# Altium footprint library 电阻封装库.PcbLib: 218 footprints (part 6 of 14)
Each footprint in its own frame and in the unit in brackets; x right, y up, seen from the top. Pads: shape width x height; smd on the part's side, far side on the other; paste and mask are expansions set on the pad; w line width, h text height; cw(c..) or ccw(c..) is an arc to the next point about the centre after c.
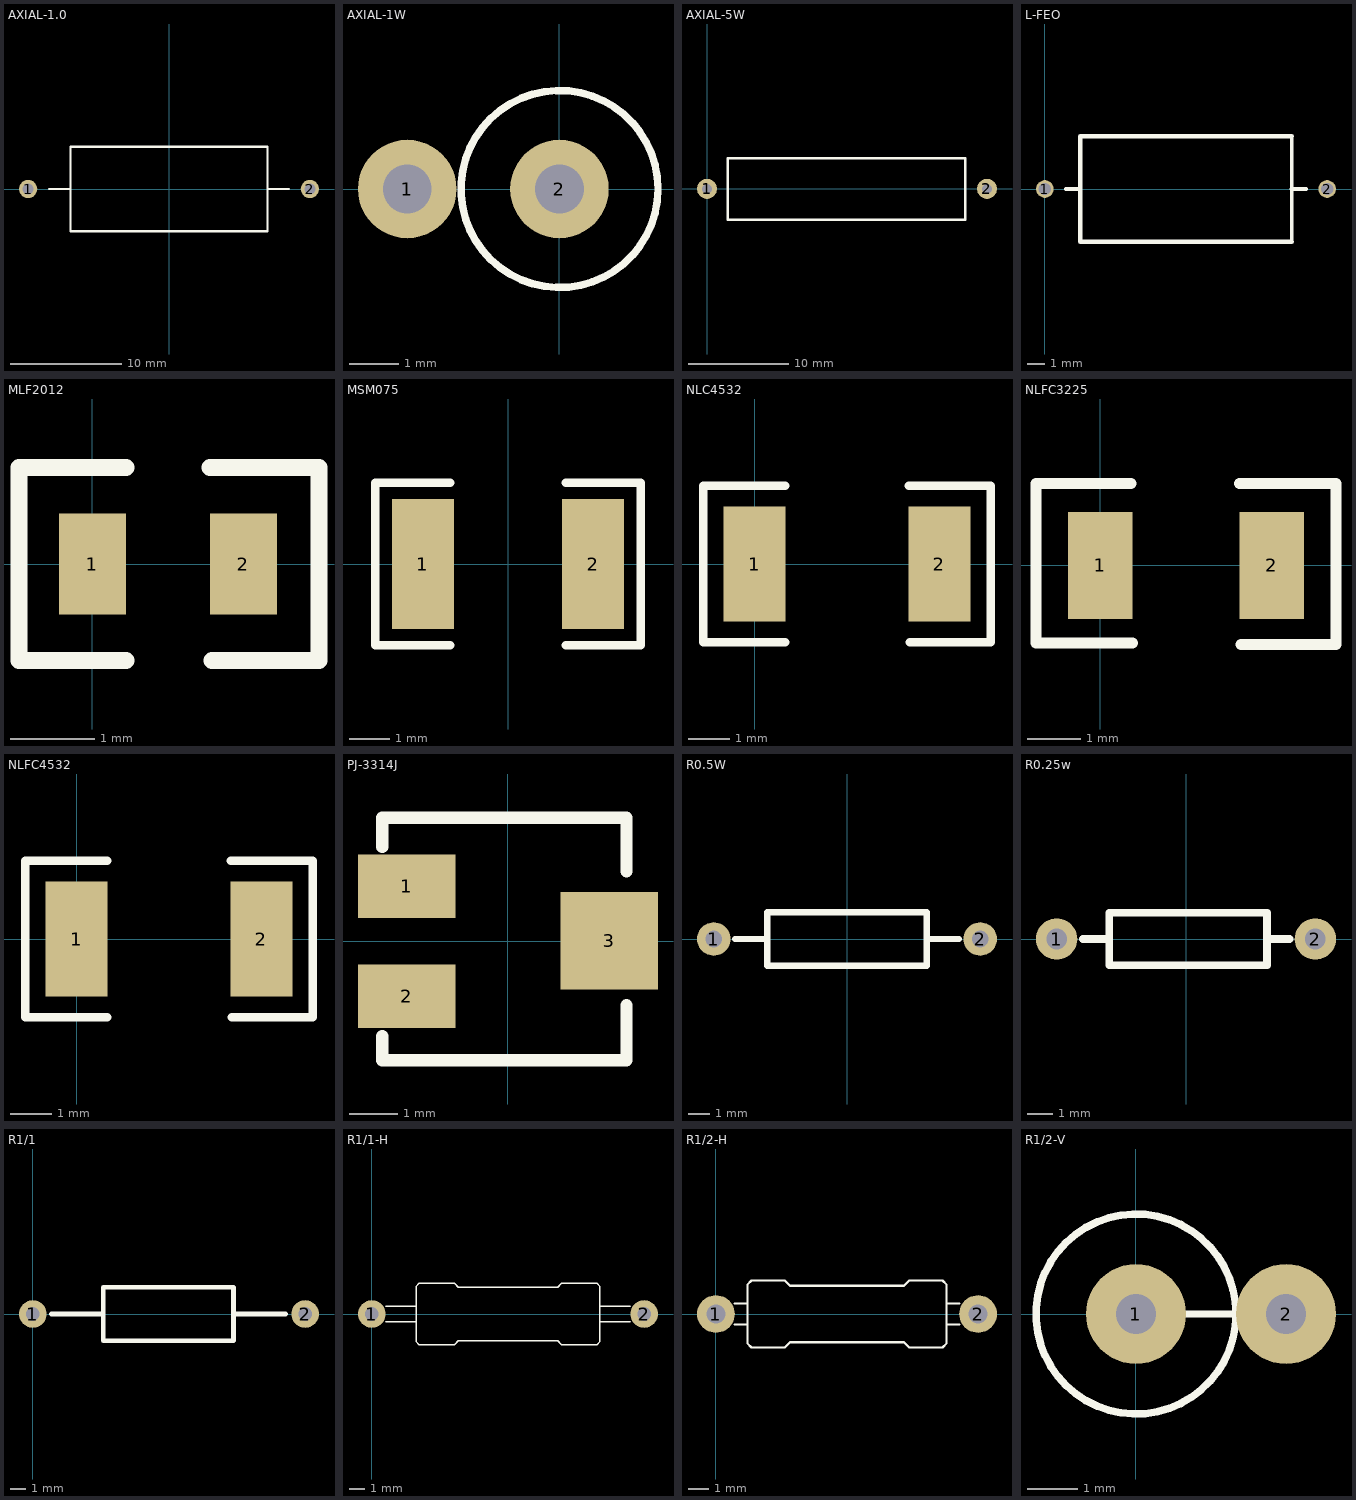
[diagram p5: the footprints below, top view; thin cyan lines are the x and y axes]

## AXIAL-1.0 [mm] "Adjustable Magnetic-Core Inductor; 2 Leads"
height 7.62
pads (2):
  round 1.65 hole 1: 1(-12.7,0) 2(12.7,0)
Top Overlay:
  lines w0.2: -10.795,0 -8.89,0 ; 8.89,0 10.795,0 ; -8.89,-3.81 8.89,-3.81 8.89,3.81 -8.89,3.81 -8.89,-3.81
3D body "AXIAL10.STEP": height 4.3, standoff -1, extent -13.068,-2.362 13.132,2.238

## AXIAL-1W [mil]
pads (2):
  round 79 hole 39: 1(-122.05,0) 2(0,0)
Top Overlay:
  circle w6: c0,0 r79
3D body "1W Carbon Film Resistor.STEP": height 572.61, standoff -75.5, extent -137.24,-83.36 83.23,82

## AXIAL-5W [mm]
pads (2):
  round 2 hole 1: 1(0,0) 2(27.915,0)
Top Overlay:
  lines w0.254: 2.07,-3.073 2.07,3.048 25.743,3.048 25.743,-3.073 2.07,-3.073
3D body "RES-5W-High.STEP": height 8.01, standoff -9, extent -0.4,-3 28.34,3

## L-FEO [mm]
pads (2):
  round 1 hole 0.7: 1(0,0) 2(16,0)
Top Overlay:
  lines w0.2: 14,-3 14,3
  lines w0.254: 1.2,0 2,0 ; 14,-3 2,-3 2,3 14,3 ; 14,0 14.8,0

## MLF2012 [mm]
pads (2):
  rect 0.8x1.2 smd: 1(0,0) 2(1.8,0)
Top Overlay:
  lines w0.203: 0.4,-1.15 -0.875,-1.15 -0.875,1.15 0.4,1.15 ; 1.4,1.15 2.7,1.15 2.7,-1.15 1.425,-1.15

## MSM075 [mm]
pads (2):
  rect 1.524x3.2 smd: 1(-2.1,0) 2(2.1,0)
Top Overlay:
  lines w0.203: -1.422,-2.007 -3.277,-2.007 -3.277,2.007 -1.422,2.007 ; 1.422,-2.007 3.277,-2.007 3.277,2.007 1.422,2.007

## NLC4532 [mm]
pads (2):
  rect 1.5x2.8 smd: 1(0,0) 2(4.5,0)
Top Overlay:
  lines w0.203: 0.75,-1.9 -1.25,-1.9 -1.25,1.9 0.75,1.9 ; 3.75,1.9 5.75,1.9 5.75,-1.9 3.775,-1.9

## NLFC3225 [mm]
pads (2):
  rect 1.2x2 smd: 1(0,0) 2(3.2,0)
Top Overlay:
  lines w0.203: 0.575,1.525 -1.199,1.525 -1.199,-1.45 0.6,-1.45 ; 2.6,1.525 4.399,1.525 4.399,-1.475 2.625,-1.475

## NLFC4532 [mm]
pads (2):
  rect 1.5x2.8 smd: 1(0,0) 2(4.5,0)
Top Overlay:
  lines w0.203: 0.75,-1.9 -1.25,-1.9 -1.25,1.9 0.75,1.9 ; 3.75,1.9 5.75,1.9 5.75,-1.9 3.775,-1.9

## PJ-3314J [mm]
pads (3):
  rect 2x1.3 smd: 1(-2.072,1.124) 2(-2.072,-1.124)
  rect 2x2 smd: 3(2.072,0.007)
Top Overlay:
  lines w0.254: -2.578,-1.95 -2.578,-2.436 2.427,-2.436 2.427,-1.31 ; -2.578,1.93 -2.578,2.528 2.427,2.528 2.427,1.429
3D body "3314J.stp": height 2.67, standoff -0.06, extent -2.54,-2.423 2.464,2.576

## R0.5W [mm]
pads (2):
  round 1.6 hole 0.8: 1(-6.35,0) 2(6.35,0)
Top Overlay:
  lines w0.305: -5.334,0 -3.81,0 ; 3.81,0 5.334,0 ; -3.81,-1.27 -3.81,1.27 3.81,1.27 3.81,-1.27 -3.81,-1.27

## R0.25w [mm]
pads (2):
  round 1.6 hole 0.8: 1(-5,0) 2(5,0)
Top Overlay:
  lines w0.305: -3.984,0 -2.968,0 ; 3.128,0 4,0 ; -2.968,-1.016 3.128,-1.016 3.128,1.016 -2.968,1.016 -2.968,-1.016

## R1/1 [mm]
pads (2):
  round 1.8 hole 0.9: 1(0,0) 2(17.78,0)
Top Overlay:
  lines w0.305: 1.2,0 4.6,0 ; 4.6,-1.75 4.6,1.75 13.1,1.75 13.1,-1.75 4.7,-1.75 ; 13.1,0 16.5,0

## R1/1-H [mm]
pads (2):
  round 1.8 hole 0.9: 1(0,0) 2(17.78,0)
Top Overlay:
  lines w0.1: 0.9,-0.5 2.89,-0.5 ; 0.9,0.5 2.89,0.5 ; 14.89,-0.5 16.88,-0.5 ; 14.89,0.5 16.88,0.5 ; 2.89,-1.802 3.088,-2 5.39,-2 5.64,-1.75 12.14,-1.75 12.39,-2 14.692,-2 14.89,-1.802 14.89,1.802 14.692,2 12.39,2 12.14,1.75 7.518,1.75 5.64,1.75 5.39,2 3.088,2 2.89,1.802 2.89,-1.802
3D body "User Library-Resistor 5-band.STEP": height 3.61, standoff -3.17, extent -0.012,-1.753 17.806,1.6

## R1/2-H [mm]
pads (2):
  round 1.8 hole 0.9: 1(0,0) 2(12.5,0)
Top Overlay:
  lines w0.1: 0.9,-0.5 1.5,-0.5 ; 0.9,0.5 1.5,0.5 ; 11,-0.5 11.6,-0.5 ; 11,0.5 11.6,0.5 ; 1.5,-1.4 1.698,-1.598 3.282,-1.598 3.532,-1.348 8.968,-1.348 9.218,-1.598 10.802,-1.598 11,-1.4 11,1.4 10.802,1.598 9.218,1.598 8.968,1.348 3.532,1.348 3.282,1.598 1.698,1.598 1.5,1.4 1.5,-1.4
3D body "User Library-Resistencia 0_5.step": height 3.6, standoff -1, extent -0.481,-1.429 12.981,1.429

## R1/2-V [mm]
pads (2):
  round 2 hole 0.8: 1(0,0) 2(3,0)
Top Overlay:
  circle w0.15: c0,0 r2
  lines w0.15: 0.754,0 2.219,0
3D body "User Library-Resistor 5-band.STEP": height 14.66, standoff -2, extent -1.874,-1.93 3.329,1.93